# Altium integrated library BYTECH_HW_LIB_2019.IntLib: 907 symbols (part 3 of 6)
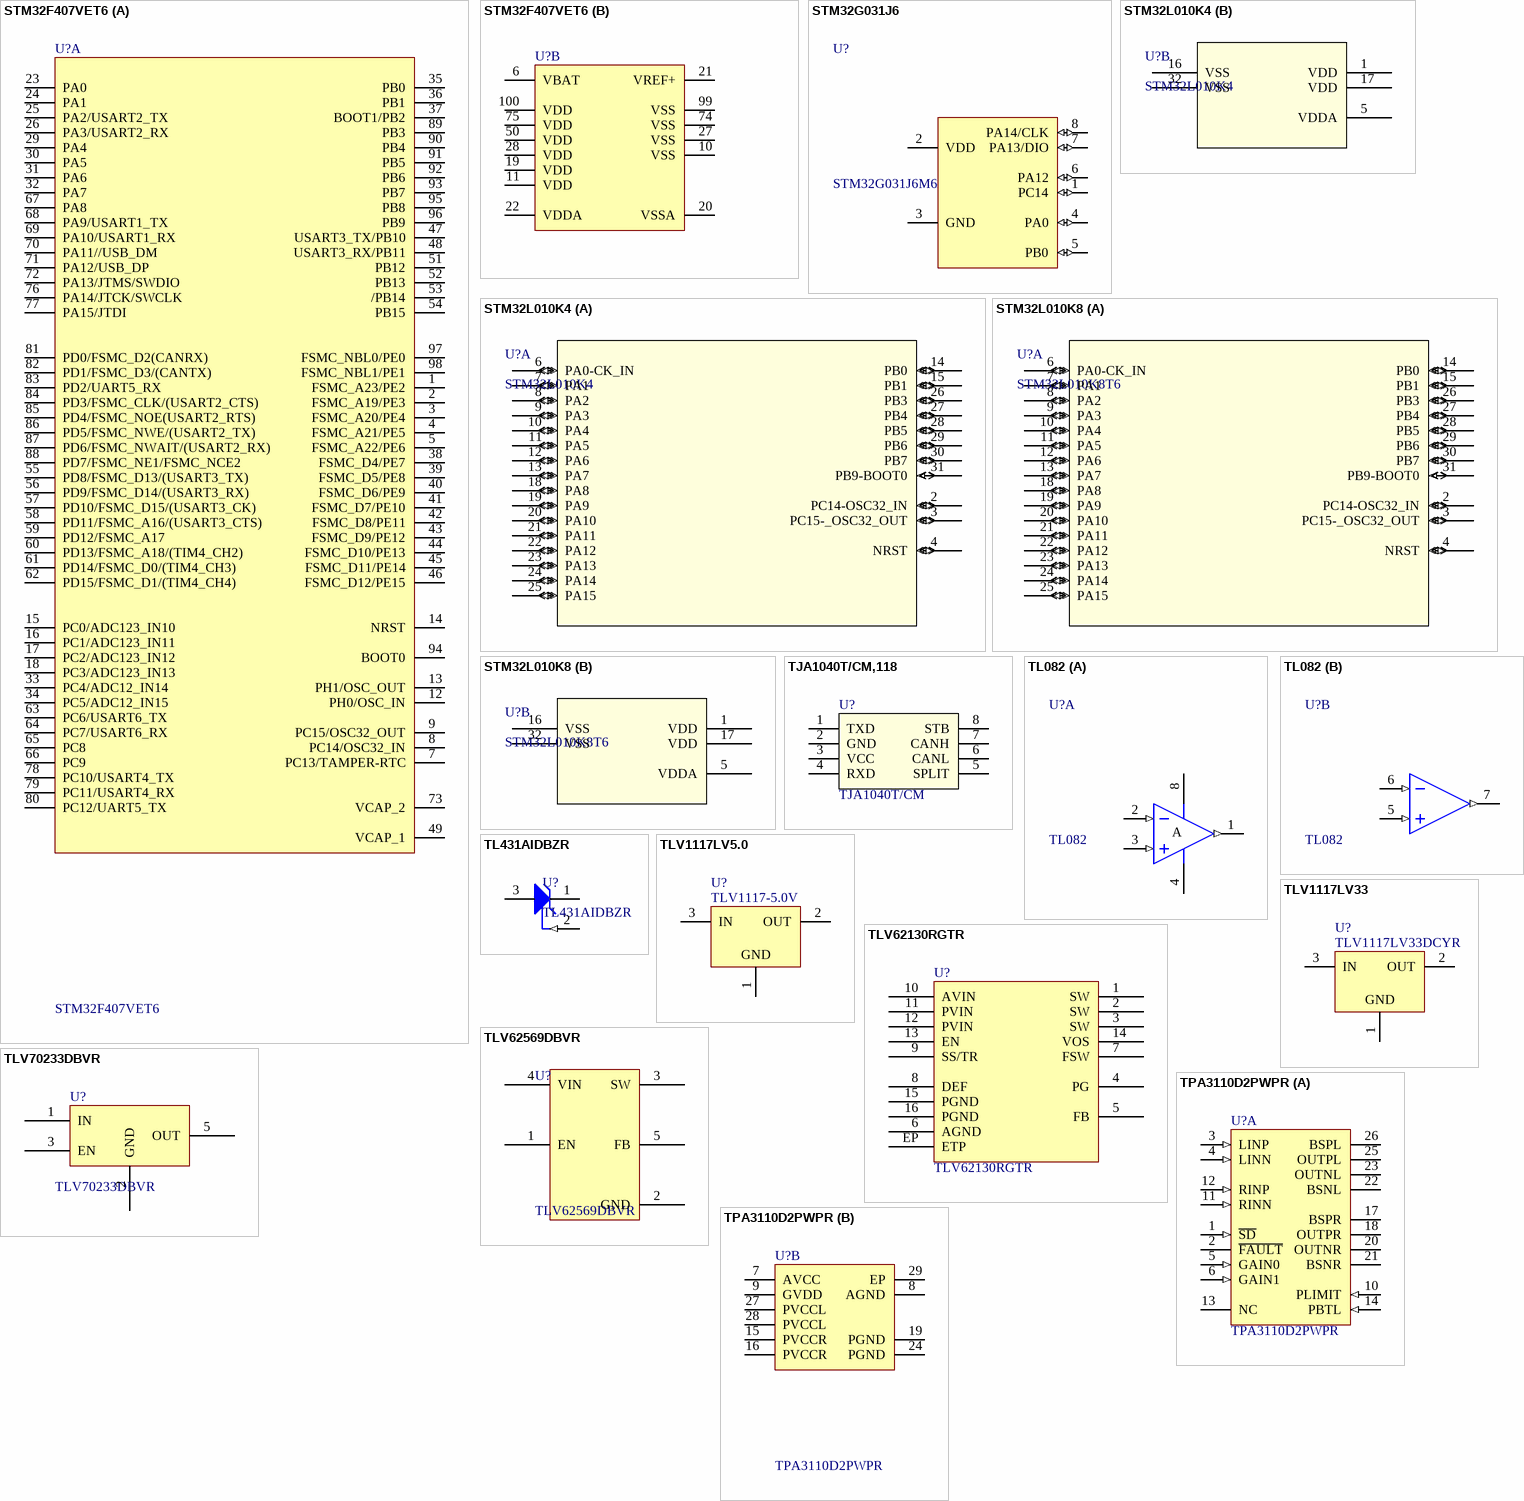
[diagram p41: symbols STM32F407VET6 to TPA3110D2PWPR]

## STM32F407VET6
designator U?
ARM Cortex-M4, 168 MHz, 192 kB RAM, 512 kB ROM; MFR: ST; MPN: STM32F407VET6
footprint LQFP-100 (Low Profile Quad Flat Pack (LQFP), 0.50 mm pitch; square, 25 pin X 25 pin, 14.00 mm L X 14.00 mm W X 1.60 mm H body)
part A pins: 1 FSMC_A23/PE2, 2 FSMC_A19/PE3, 3 FSMC_A20/PE4, 4 FSMC_A21/PE5, 5 FSMC_A22/PE6, 7 PC13/TAMPER-RTC, 8 PC14/OSC32_IN, 9 PC15/OSC32_OUT, 12 PH0/OSC_IN, 13 PH1/OSC_OUT, 14 NRST, 15 PC0/ADC123_IN10, 16 PC1/ADC123_IN11, 17 PC2/ADC123_IN12, 18 PC3/ADC123_IN13, 23 PA0, 24 PA1, 25 PA2/USART2_TX, 26 PA3/USART2_RX, 29 PA4, 30 PA5, 31 PA6, 32 PA7, 33 PC4/ADC12_IN14, 34 PC5/ADC12_IN15, 35 PB0, 36 PB1, 37 BOOT1/PB2, 38 FSMC_D4/PE7, 39 FSMC_D5/PE8, 40 FSMC_D6/PE9, 41 FSMC_D7/PE10, 42 FSMC_D8/PE11, 43 FSMC_D9/PE12, 44 FSMC_D10/PE13, 45 FSMC_D11/PE14, 46 FSMC_D12/PE15, 47 USART3_TX/PB10, 48 USART3_RX/PB11, 49 VCAP_1, 51 PB12, 52 PB13, 53 /PB14, 54 PB15, 55 PD8/FSMC_D13/(USART3_TX), 56 PD9/FSMC_D14/(USART3_RX), 57 PD10/FSMC_D15/(USART3_CK), 58 PD11/FSMC_A16/(USART3_CTS), 59 PD12/FSMC_A17, 60 PD13/FSMC_A18/(TIM4_CH2), 61 PD14/FSMC_D0/(TIM4_CH3), 62 PD15/FSMC_D1/(TIM4_CH4), 63 PC6/USART6_TX, 64 PC7/USART6_RX, 65 PC8, 66 PC9, 67 PA8, 68 PA9/USART1_TX, 69 PA10/USART1_RX, 70 PA11//USB_DM, 71 PA12/USB_DP, 72 PA13/JTMS/SWDIO, 73 VCAP_2, 76 PA14/JTCK/SWCLK, 77 PA15/JTDI, 78 PC10/USART4_TX, 79 PC11/USART4_RX, 80 PC12/UART5_TX, 81 PD0/FSMC_D2(CANRX), 82 PD1/FSMC_D3/(CANTX), 83 PD2/UART5_RX, 84 PD3/FSMC_CLK/(USART2_CTS), 85 PD4/FSMC_NOE(USART2_RTS), 86 PD5/FSMC_NWE/(USART2_TX), 87 PD6/FSMC_NWAIT/(USART2_RX), 88 PD7/FSMC_NE1/FSMC_NCE2, 89 PB3, 90 PB4, 91 PB5, 92 PB6, 93 PB7, 94 BOOT0, 95 PB8, 96 PB9, 97 FSMC_NBL0/PE0, 98 FSMC_NBL1/PE1
part B pins: 6 VBAT, 10 VSS, 11 VDD, 19 VDD, 20 VSSA, 21 VREF+, 22 VDDA, 27 VSS, 28 VDD, 50 VDD, 74 VSS, 75 VDD, 99 VSS, 100 VDD

## STM32G031J6
designator U?, comment STM32G031J6M6
MAINSTREAM ARM CORTEX-M0+ MCU WI; MFR: STM; Solder: SMT; MPN: STM32G031J6M6; Value: STM32G031J6M6; Category: IC; PinCount: 8
footprint SOIC-8
pins: 1 PC14 (io), 2 VDD, 3 GND, 4 PA0 (io), 5 PB0 (io), 6 PA12 (io), 7 PA13/DIO (io), 8 PA14/CLK (io)

## STM32L010K4
designator U?
ARM® Cortex®-M0+ STM32L0 MCUIC 32-Bit 32MHz 16KB (16K x 8); MFR: STMicroelectronics; Solder: SMT; MPM: STM32L010K4; Category: IC; PinCount: 32; Value: STM32L010K4
footprint STM-LQFP32_M (QFP, 32-Leads, Body 7x7mm, Pitch 0.8mm, IPC Low Density)
part A pins: 2 PC14-OSC32_IN (io), 3 PC15-_OSC32_OUT (io), 4 NRST (io), 6 PA0-CK_IN (io), 7 PA1 (io), 8 PA2 (io), 9 PA3 (io), 10 PA4 (io), 11 PA5 (io), 12 PA6 (io), 13 PA7 (io), 14 PB0 (io), 15 PB1 (io), 18 PA8 (io), 19 PA9 (io), 20 PA10 (io), 21 PA11 (io), 22 PA12 (io), 23 PA13 (io), 24 PA14 (io), 25 PA15 (io), 26 PB3 (io), 27 PB4 (io), 28 PB5 (io), 29 PB6 (io), 30 PB7 (io), 31 PB9-BOOT0 (in)
part B pins: 1 VDD (power), 5 VDDA (power), 16 VSS (power), 17 VDD (power), 32 VSS (power)

## STM32L010K8
designator U?, comment STM32L010K8T6
ARM® Cortex®-M0+ STM32L0 MCUIC 32-Bit 32MHz 16KB (16K x 8); MFR: STMicroelectronics; Solder: SMT; MPM: STM32L010K8T6; Category: IC; PinCount: 32; Value: STM32L010K8T6
footprint STM-LQFP32_M (QFP, 32-Leads, Body 7x7mm, Pitch 0.8mm, IPC Low Density)
part A pins: 2 PC14-OSC32_IN (io), 3 PC15-_OSC32_OUT (io), 4 NRST (io), 6 PA0-CK_IN (io), 7 PA1 (io), 8 PA2 (io), 9 PA3 (io), 10 PA4 (io), 11 PA5 (io), 12 PA6 (io), 13 PA7 (io), 14 PB0 (io), 15 PB1 (io), 18 PA8 (io), 19 PA9 (io), 20 PA10 (io), 21 PA11 (io), 22 PA12 (io), 23 PA13 (io), 24 PA14 (io), 25 PA15 (io), 26 PB3 (io), 27 PB4 (io), 28 PB5 (io), 29 PB6 (io), 30 PB7 (io), 31 PB9-BOOT0 (in)
part B pins: 1 VDD (power), 5 VDDA (power), 16 VSS (power), 17 VDD (power), 32 VSS (power)

## TJA1040T/CM,118
designator U?, comment TJA1040T/CM
IC TRANSCEIVER CAN 8SOIC; MPN: TJA1040T/CM,118; Solder: SMT; Value: TJA1040T/CM; Category: IC
footprint SOIC-8
pins: 1 TXD, 2 GND, 3 VCC, 4 RXD, 5 SPLIT, 6 CANL, 7 CANH, 8 STB

## TL082
designator U?
IC OPAMP JFET 2 CIRCUIT 8SO; MPN: TL082CDT; MFR: STM; Solder: SMT; Value: TL082; Category: IC; PinCount: 8
footprint SOIC-8
part A pins: 1 OUT (out), 2 IN- (in), 3 IN+ (in), 4 V- (power), 8 V+ (power)
part B pins: 5 IN+ (in), 6 IN- (in), 7 OUT (out)
part A text: A

## TL431AIDBZR
designator U?
IC VREF SHUNT ADJ SOT23-3; Solder: SMT; MPN: TL431AIDBZR; Value: TL431AIDBZR; Category: IC
footprint SOT23_3 (SOT23, 3-Leads, Body 2,90x2,30mm, Pitch 0,95mm, IPC Medium Density)
pins: 1 CATHODE, 2 REF (in), 3 ANODE

## TLV1117LV5.0
designator U?, comment TLV1117-5.0V
IC REG LINEAR 5V 800MA SOT223-4; MFR: Texas Instruments; MPN: TLV1117-50CDCYR; Solder: SMT; Value: TLV1117-50; Category: IC
footprint SOT-223-4
pins: 1 GND (power) "Ground pin", 2 OUT (power) "Regulated output voltage pin.", 3 IN (power) "Input pin."

## TLV1117LV33
designator U?, comment TLV1117LV33DCYR
Single Output LDO, 1 A, Fixed 3.3 V Output, 2 to 5.5 V Input, 4-pin SOT-223 (DCY), -40 to 125 degC, Green (RoHS & no Sb/Br); MFR: Texas Instruments; Solder: SMT; MPN: TLV1117LV33DCYR; Value: TLV1117LV33; Category: IC
footprint SOT-223-4
pins: 1 GND (power) "Ground pin", 2 OUT (power) "Regulated output voltage pin.", 3 IN (power) "Input pin."

## TLV62130RGTR
designator U?
IC REG BUCK ADJ 3A SYNC 16QFN; Solder: SMT; MPN: TLV62130RGTR; Value: TLV62130RGTR; Category: IC
footprint QFN16 30X30 (QFN, 16-Leads, Body 3.00x3.00mm, Pitch 0.50mm, Thermal Pad 1.70x1.70mm, IPC Medium Density)
pins: 1 SW, 2 SW, 3 SW, 4 PG, 5 FB, 6 AGND, 7 FSW, 8 DEF, 9 SS/TR, 10 AVIN, 11 PVIN, 12 PVIN, 13 EN, 14 VOS, 15 PGND, 16 PGND, EP ETP

## TLV62569DBVR
designator U?
IC REG BUCK ADJ 2A SOT23-5; MFR: Texas Instruments; Solder: SMT; MPN: TLV62569DBVR; Value: TLV62569DBVR; Category: IC; PinCount: 5
footprint SOT23-5
pins: 1 EN, 2 GND, 3 SW, 4 VIN, 5 FB

## TLV70233DBVR
designator U?
IC REG LDO 3.3V 0.3A SOT23-5; Solder: SMT; MPN: TLV70233DBVR; Value: TLV70233DBVR; Category: IC
footprint SOT23-5
pins: 1 IN, 2 GND, 3 EN, 5 OUT

## TPA3110D2PWPR
designator U?
15 W Filter-Free Class D Stereo Amplifier with SpeakerGuard(TM), -40 to 85 degC, 28-pin SOP (PWP28), Green (RoHS & no Sb/Br); MFR: Texas Instruments; Solder: SMT; MPN: TPA3110D2PWPR; Value: TPA3110D2PWPR; CompanyID: *
footprint TI-PWP28-5720X1950TP_L (SOP, 28-Leads, Body 9.8x4.5mm, Pitch 0.65mm, Thermal Pad 6.17x2.4mm, IPC High Density)
part A pins: 1 ~{SD} (in) "Shutdown logic input for audio amp (LOW = outputs Hi-Z, HIGH = outputs enabled). TTL logic levels with compliance to AVCC.", 2 ~{FAULT} (oc) "Open drain output used to display short circuit or dc detect fault status. Voltage compliant to AVCC. Short circuit faults can be set to auto-recovery by connecting F\A\U\L\T\ pin to S\D\ pin. Otherwise, both short circuit (See Datasheet)", 3 LINP (in) "Positive audio input for left channel. Biased at 3V.", 4 LINN (in) "Negative audio input for left channel. Biased at 3V.", 5 GAIN0 (in) "Gain select least significant bit. TTL logic levels with compliance to AVCC.", 6 GAIN1 (in) "Gain select most significant bit. TTL logic levels with compliance to AVCC.", 10 PLIMIT (in) "Power limit level adjust. Connect a resistor divider from GVDD to GND to set power limit. Connect directly to GVDD for no power limit", 11 RINN (in) "Negative audio input for right channel. Biased at 3V.", 12 RINP (in) "Positive audio input for right channel. Biased at 3V.", 13 NC "Not connected", 14 PBTL (in) "Parallel BTL mode switch", 17 BSPR "Bootstrap I/O for right channel, positive high-side FET.", 18 OUTPR (hiz) "Class-D H-bridge positive output for right channel.", 20 OUTNR (hiz) "Class-D H-bridge negative output for right channel.", 21 BSNR "Bootstrap I/O for right channel, negative high-side FET.", 22 BSNL "Bootstrap I/O for left channel, negative high-side FET.", 23 OUTNL (hiz) "Class-D H-bridge negative output for left channel.", 25 OUTPL (hiz) "Class-D H-bridge positive output for left channel.", 26 BSPL "Bootstrap I/O for left channel, positive high-side FET."
part B pins: 7 AVCC (power) "Analog supply", 8 AGND (power) "Analog signal ground. Connect to the thermal pad.", 9 GVDD (power) "High-side FET gate drive supply. Nominal voltage is 7V. Also should be used as supply for PLIMIT function", 15 PVCCR (power) "Power supply for right channel H-bridge. Right channel and left channel power supply inputs are connect internally", 16 PVCCR (power) "Power supply for right channel H-bridge. Right channel and left channel power supply inputs are connect internally.", 19 PGND (power) "Power ground for the H-bridges.", 24 PGND (power) "Power ground for the H-bridges.", 27 PVCCL (power) "Power supply for left channel H-bridge. Right channel and left channel power supply inputs are connect internally", 28 PVCCL (power) "Power supply for left channel H-bridge. Right channel and left channel power supply inputs are connect internally", 29 EP (power)

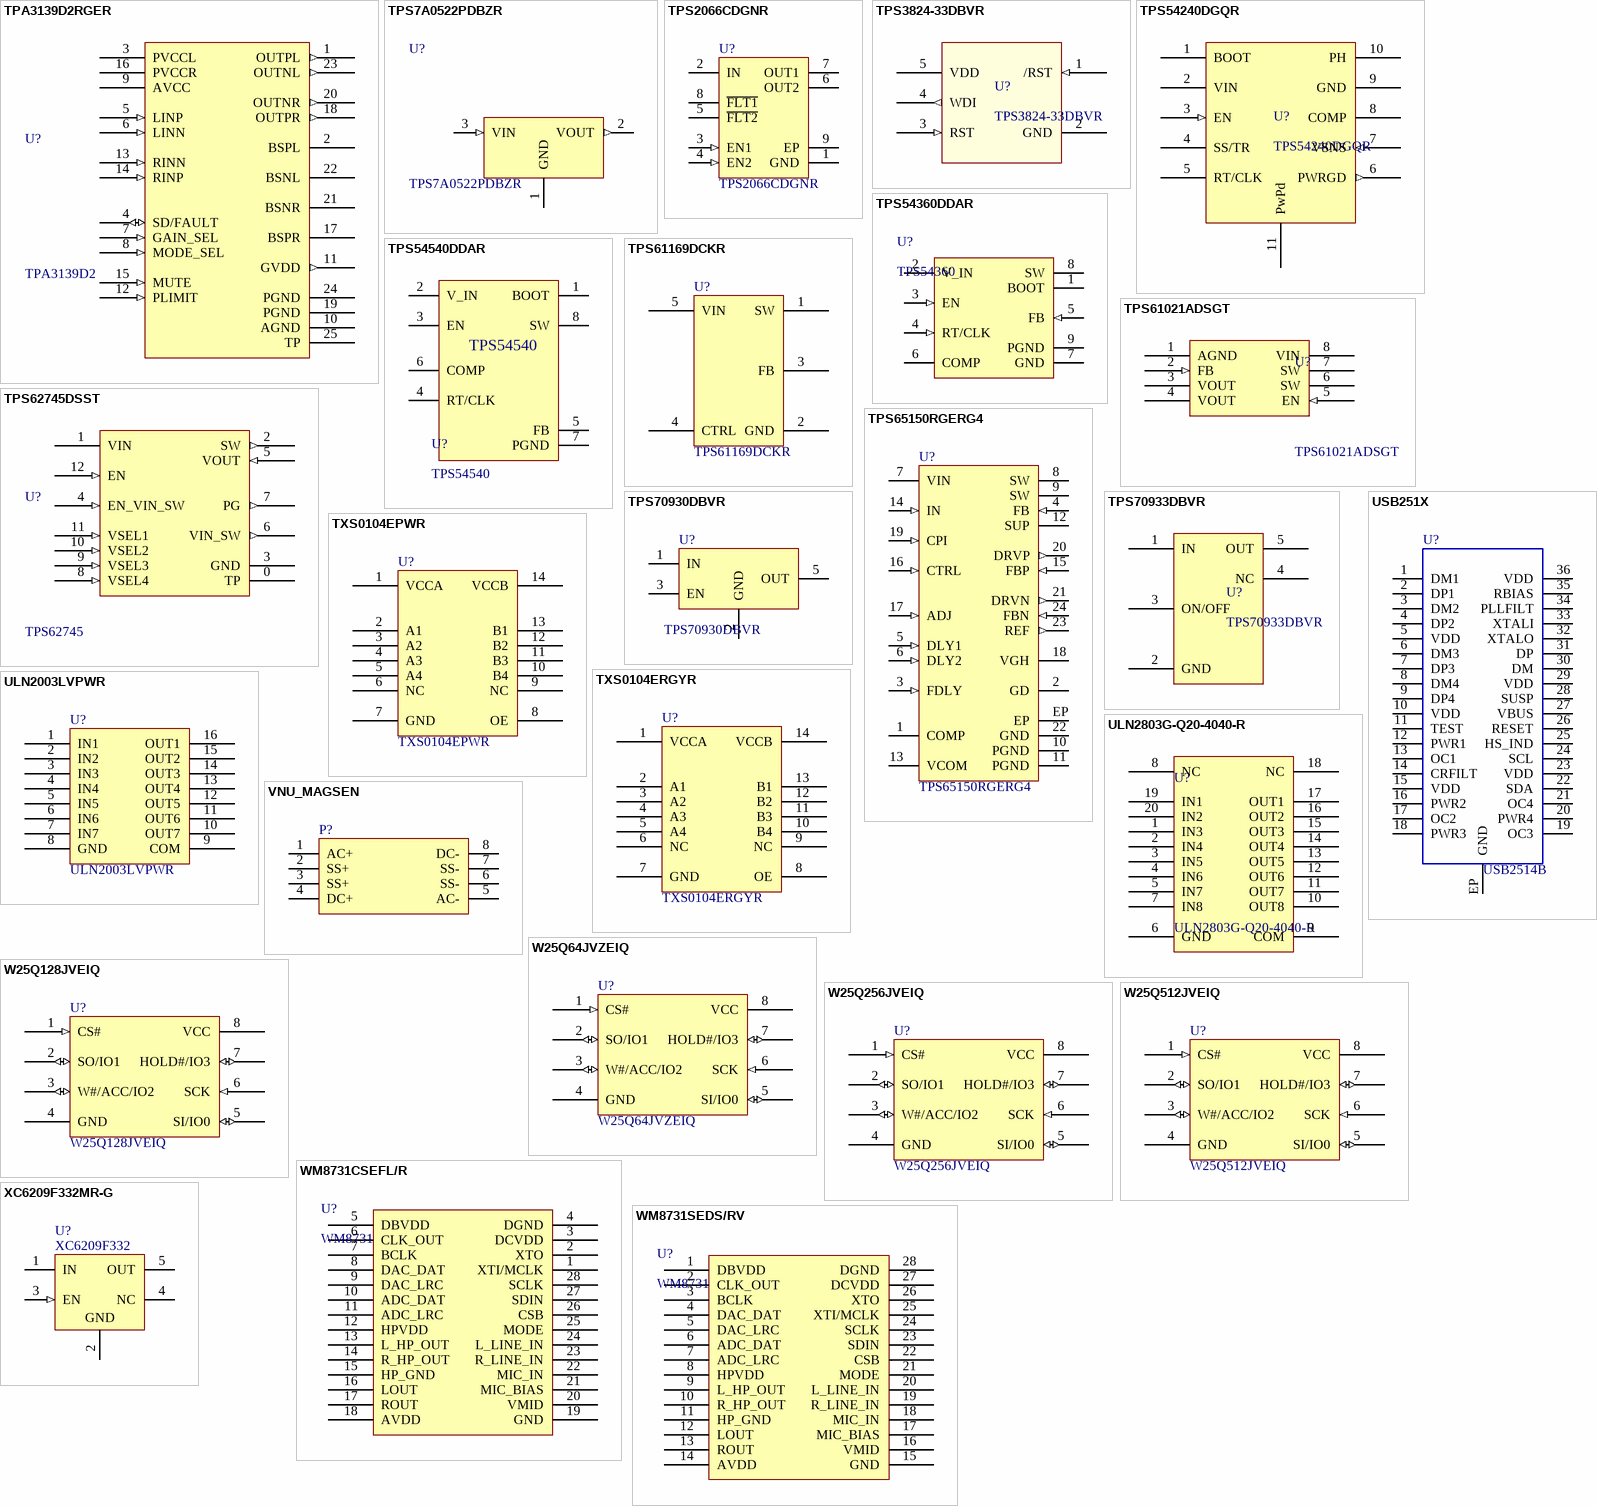
[diagram p15: symbols TPA3139D2RGER to XC6209F332MR-G]

## TPA3139D2RGER
designator U?, comment TPA3139D2
10W 3.5V–14.4V stereo QFN Class-D audio amplifier; MPN: TPA3139D2RGER; Solder: SMT; Value: TPA3139D2; Category: IC; PinCount: 24
footprint QFN50P400X400X100_HS-25N (Footprint not found)
pins: 1 OUTPL (out), 2 BSPL (power), 3 PVCCL (power), 4 SD/FAULT (io), 5 LINP (in), 6 LINN (in), 7 GAIN_SEL (in), 8 MODE_SEL (in), 9 AVCC (power), 10 AGND (power), 11 GVDD (out), 12 PLIMIT (in), 13 RINN (in), 14 RINP (in), 15 MUTE (in), 16 PVCCR (power), 17 BSPR (power), 18 OUTPR (out), 19 PGND (power), 20 OUTNR (out), 21 BSNR (power), 22 BSNL (power), 23 OUTNL (out), 24 PGND (power), 25 TP (power)

## TPS7A0522PDBZR
designator U?
IC POWER MANAGEMENT; MFR: TI; Solder: SMT; MPN: TPS7A0522PDBZR; Value: TPS7A0522PDBZR; Category: IC; PinCount: 3
footprint SOT23_3 (SOT23, 3-Leads, Body 2,90x2,30mm, Pitch 0,95mm, IPC Medium Density)
pins: 1 GND, 2 VOUT (out), 3 VIN (in)

## TPS2066CDGNR
designator U?
Dual-Channel, Current-Limited, Power-Distribution Switch, 1.11 to 1.85 A Current Limit, -40 to 85 degC, 8-pin MSOP-PowerPAD (DGN), Green (RoHS & no Sb/Br); Solder: SMT; MPN: TPS2066CDGNR; Value: TPS2066CDGNR; Category: IC
pins: 1 GND (power) "Ground connection", 2 IN (power) "Input voltage and power-switch drain; connect a 0.1 uF or greater ceramic capacitor from IN to GND close to the IC", 3 EN1 (in) "Enable input channel 1, logic high turns on power switch", 4 EN2 (in) "Enable input channel 2, logic high turns on power switch", 5 ~{FLT2} (hiz) "Active-low open-drain output, asserted during overcurrent, or overtemperature conditions on channel 2", 6 OUT2 (power) "Power-switch output channel 2, connected to load", 7 OUT1 (power) "Power-switch output channel 1, connected to load", 8 ~{FLT1} (hiz) "Active-low open-drain output, asserted during overcurrent, or overtemperature conditions on channel 1", 9 EP (power) "Internally connected to GND; used to heat-sink the part to the circuit board traces. Connect PAD to GND plane as a heatsink."

## TPS3824-33DBVR
designator U?
IC 2.93V SUPPLY MONITOR SOT-23-5; Solder: SMT; Value: TPS3824-33DBVR; MPN: TPS3824-33DBVR; Category: IC
footprint SOT23-5
pins: 1 /RST (in), 2 GND (power), 3 RST (in), 4 WDI (out), 5 VDD (power)

## TPS54240DGQR
designator U?
IC REG BCK SPLIT RAIL ADJ 10MSOP; Solder: SMT; MPN: TPS54240DGQR; Value: TPS54240DGQR; Category: IC
footprint HVSSOP-10
pins: 1 BOOT, 2 VIN (power), 3 EN (in), 4 SS/TR, 5 RT/CLK, 6 PWRGD (out), 7 VSNS (in), 8 COMP, 9 GND (power), 10 PH, 11 PwPd

## TPS54360DDAR
designator U?, comment TPS54360
Step Down DC-DC Converter; MPN: TPS54360DDAR; Solder: SMT; Value: TPS54360; Category: IC
footprint SOIC-8-TP (SOIC 8 pin with Thermal Pad)
pins: 1 BOOT, 2 V_IN, 3 EN (in), 4 RT/CLK (in), 5 FB (in), 6 COMP, 7 GND, 8 SW, 9 TP hidden to PGND, 9 PGND

## TPS54540DDAR
designator U?, comment TPS54540
4.5-V to 42-V Input, 5 A, Step Down DC-DC Converter  with Eco-mode™; MPN: TPS54540DDAR; Solder: SMT; Value: TPS54540; Category: IC
footprint SOIC8 - TP (SOIC 8 pin with Thermal Pad)
pins: 1 BOOT, 2 V_IN, 3 EN, 4 RT/CLK, 5 FB, 6 COMP, 7 PGND, 8 SW, 9 TP hidden to PGND

## TPS61021ADSGT
designator U?
IC REG BOOST ADJ 3A 8WSON; Solder: SMT; MPN: TPS61021ADSGT; Value: TPS61021ADSGT; Category: IC
footprint WFDFN-8 (SON, 8-Leads, Body 2.00x2.00mm, Pitch 0.50mm, Thermal Pad 1.60x0.64mm, IPC Medium Density)
pins: 1 AGND (power), 2 FB (in), 3 VOUT (power), 4 VOUT (power), 5 EN (in), 6 SW (power), 7 SW (power), 8 VIN (power)

## TPS61169DCKR
designator U?
IC LED DRVR RGLTR DIM 1.8A SC70; Solder: SMT; MPN: TPS61169DCKR; Value: TPS61169DCKR; Category: IC
pins: 1 SW, 2 GND, 3 FB, 4 CTRL, 5 VIN

## TPS62745DSST
designator U?, comment TPS62745
IC REG BUCK PROG 300MA 12WSON; MPN: TPS62745DSST; MFR: Texas Instruments; Solder: SMT; Value: TPS62745; Category: IC; PinCount: 11
footprint WSON12_3x2 (Footprint not found)
pins: 0 TP, 1 VIN (power), 2 SW (out), 3 GND (power), 4 EN_VIN_SW (in), 5 VOUT (in), 6 VIN_SW (out), 7 PG (out), 8 VSEL4 (in), 9 VSEL3 (in), 10 VSEL2 (in), 11 VSEL1 (in), 12 EN (in)

## TPS65150RGERG4
designator U?
3-Channel LCD Bias with GPM, VCOM Buffer & Gate Driver for Isolation Switch, 1.8 to 6 V, -40 to 85 degC, 24-pin QFN (RGE24), Green (RoHS & no Sb/Br); Solder: SMT; MPN: TPS65150RGERG4; Value: TPS65150; Category: IC
pins: 1 COMP "This is the compensation pin for the main boost converter. A small capacitor and if required a series resistor is connected to this pin.", 2 GD (hiz) "Active low open drain output. This output is latched low when the boost converter Vs is in regulation. This signal can be used to drive an external MOSFET to provide isolation for Vs.", 3 FDLY (in) "Fault delay. Connecting a capacitor from this pin to Vin allows to set the delay time from the point when one of the outputs (VS, VGH, VGL) drops below its power good threshold until the devices enters the shutdown latch. To (See Datasheet)", 4 FB (in) "Feedback of the main boost converter generating Vsource (Vs).", 5 DLY1 (in) "Power-on sequencing adjust. Connecting a capacitor from this pin to GND allows to set the delay time between the boost converter output Vs and the negative charge pump VGL during startup.", 6 DLY2 (in) "Power-on sequencing adjust. Connecting a capacitor from this pin to GND allows to set the delay time between the negative charge pump VGL and the positive charge pump during startup. Note that Q5 in the Gate Voltage Shaping (See Datasheet)", 7 VIN (power) "This is the input voltage pin of the device.", 8 SW (power) "Switch pin of the boost converter", 9 SW (power) "Switch pin of the boost converter", 10 PGND (power) "Power ground", 11 PGND (power) "Power ground", 12 SUP (power) "Supply pin of the positive, negative charge pump and Boost Converter Gate Drive Circuit. This pin needs to be connected to the output of the main boost converter and can’t be to any other voltage rail.", 13 VCOM (power) "VCOM buffer output. Typically a 1-uF output capacitor is required on this pin.", 14 IN (in) "Input of the Vcom buffer. If this pin is connected to GND, the Vcom buffer is disabled.", 15 FBP (in) "Feedback pin of the positive charge pump.", 16 CTRL (in) "Control signal for the gate voltage shaping signal. Apply the control signal for the gate voltage control. Usually the timing controller of the LCD panel generates this signal. If this function is not required, this pin (See Datasheet)", 17 ADJ (in) "Gate voltage shaping circuit. Connecting a capacitor to this pin sets the fall time of the positive gate voltage (VGH).", 18 VGH (hiz) "Positive output voltage to drive the TFT gates with an adjustable falltime. This pin is internally connected with a MOSFET switch to the positive charge pump input CPI.", 19 CPI (in) "Input of the VGH isolation switch and gate voltage shaping circuit.", 20 DRVP (out) "Charge pump driver to generate the positive output voltage VGH.", 21 DRVN (out) "Charge pump driver to generate the negative voltage VGL.", 22 GND (power) "Analog ground", 23 REF (out) "Internal reference output typically 1.213 V", 24 FBN (in) "Feedback pin of the negative charge pump VGL.", EP (power) "The PowerPADTM needs to be soldered to GND"

## TPS70930DBVR
designator U?
IC REG LINEAR 3V 150MA SOT23-5; MFR: TI; Solder: SMT; MPN: TPS70930DBVR; Value: TPS70930DBVR; Category: IC
footprint SOT23-5
pins: 1 IN, 2 GND, 3 EN, 5 OUT

## TPS70933DBVR
designator U?
IC REG LINEAR 3.3V 150MA SOT23-5; MFR: Texas Instruments; Solder: SMT; MPN: TPS70933DBVR; Value: TPS70933DBVR; Category: IC
footprint SOT23-5
pins: 1 IN, 2 GND, 3 ON/OFF, 4 NC, 5 OUT

## TXS0104EPWR
designator U?
IC 4BIT NON-INV TRANSLTR 14TSSOP; Solder: SMT; Value: TXS0104EPWR; MPN: TXS0104EPWR; Category: IC
footprint TSOP65P640X120-14N (TSOP, 14-Leads, Body 5.00x4.40mm, Pitch 0.65mm, IPC Medium Density)
pins: 1 VCCA, 2 A1, 3 A2, 4 A3, 5 A4, 6 NC, 7 GND, 8 OE, 9 NC, 10 B4, 11 B3, 12 B2, 13 B1, 14 VCCB

## TXS0104ERGYR
designator U?
IC TRNSLTR BIDIRECTIONAL 14VQFN; MFR: Texas Instruments; Solder: SMT; Value: TXS0104ERGYR; MPN: TXS0104ERGYR; Category: IC; PinCount: 14
footprint QFN50P400X400X80_HS-15N (QFN, 14-Leads, Body 4.00x4.00mm, Pitch 0.50mm, Thermal Pad 2.05x2.05mm, IPC Medium Density)
pins: 1 VCCA, 2 A1, 3 A2, 4 A3, 5 A4, 6 NC, 7 GND, 8 OE, 9 NC, 10 B4, 11 B3, 12 B2, 13 B1, 14 VCCB

## ULN2003LVPWR
designator U?
IC DARL ARRAY 7CH 16TSSOP; MFR: Texas Instruments; Solder: SMT; CompanyID: VT-0; MPN: ULN2003LVPWR; Category: Integrated Circuits (ICs); Value: ULN2003LVPWR
footprint TSOP65P640X120-16N (TSOP, 16-Leads, Body 5.00x4.40mm, Pitch 0.65mm, IPC Medium Density)
pins: 1 IN1, 2 IN2, 3 IN3, 4 IN4, 5 IN5, 6 IN6, 7 IN7, 8 GND, 9 COM, 10 OUT7, 11 OUT6, 12 OUT5, 13 OUT4, 14 OUT3, 15 OUT2, 16 OUT1

## ULN2803G-Q20-4040-R
designator U?
IC DARL ARRAY 7CH QFN-20; MFR: UNISONIC; Solder: SMT; MPN: ULN2803G-Q20-4040-R; Category: Integrated Circuits (ICs); Value: ULN2803G-Q20-4040-R; PinCount: 20
footprint QFN-20(4x4) (Footprint not found)
pins: 1 IN3, 2 IN4, 3 IN5, 4 IN6, 5 IN7, 6 GND, 7 IN8, 8 NC, 9 COM, 10 OUT8, 11 OUT7, 12 OUT6, 13 OUT5, 14 OUT4, 15 OUT3, 16 OUT2, 17 OUT1, 18 NC, 19 IN1, 20 IN2

## USB251X
designator U?, comment USB2514B
IC HUB CTLR 4PORT USB 2.0 HS 36S; MPN: USB2514B/M2; Solder: SMT; Value: USB2514B; Category: IC
footprint QFN36(USB251x)
pins: 1 DM1, 2 DP1, 3 DM2, 4 DP2, 5 VDD, 6 DM3, 7 DP3, 8 DM4, 9 DP4, 10 VDD, 11 TEST, 12 PWR1, 13 OC1, 14 CRFILT, 15 VDD, 16 PWR2, 17 OC2, 18 PWR3, 19 OC3, 20 PWR4, 21 OC4, 22 SDA, 23 VDD, 24 SCL, 25 HS_IND, 26 RESET, 27 VBUS, 28 SUSP, 29 VDD, 30 DM, 31 DP, 32 XTALO, 33 XTALI, 34 PLLFILT, 35 RBIAS, 36 VDD, EP GND

## VNU_MAGSEN
designator P?
VNU Magnetic Sensor 2020; Solder: WAVE
footprint VNU_MAG_SEN_V1.0_DIP
footprint VNU_MAG_SEN_V1.0_SMD
pins: 1 AC+, 2 SS+, 3 SS+, 4 DC+, 5 AC-, 6 SS-, 7 SS-, 8 DC-

## W25Q64JVZEIQ
designator U?
IC FLASH 64M SPI 133MHZ 8WSON; MFR: Winbond Electronics; Solder: SMT; MPN: W25Q64JVZEIQ; Value: W25Q64JVZEIQ; Category: IC; PinCount: 9
footprint WSON-8 (6x8mm)
pins: 1 CS# (in), 2 SO/IO1 (io), 3 W#/ACC/IO2 (io), 4 GND (power), 5 SI/IO0 (io), 6 SCK (in), 7 HOLD#/IO3 (io), 8 VCC (power)

## W25Q128JVEIQ
designator U?
IC FLASH 128M SPI 133MHZ 8WSON; MFR: Winbond Electronics; Solder: SMT; MPN: W25Q128JVEIQ; Value: W25Q128JVEIQ; Category: IC; PinCount: 9
footprint WSON-8 (6x8mm)
pins: 1 CS# (in), 2 SO/IO1 (io), 3 W#/ACC/IO2 (io), 4 GND (power), 5 SI/IO0 (io), 6 SCK (in), 7 HOLD#/IO3 (io), 8 VCC (power)

## W25Q256JVEIQ
designator U?
IC FLASH 256M SPI 133MHZ 8WSON; MFR: Winbond Electronics; Solder: SMT; MPN: W25Q256JVEIQ; Value: W25Q256JVEIQ; Category: IC; PinCount: 9
footprint WSON-8 (6x8mm)
pins: 1 CS# (in), 2 SO/IO1 (io), 3 W#/ACC/IO2 (io), 4 GND (power), 5 SI/IO0 (io), 6 SCK (in), 7 HOLD#/IO3 (io), 8 VCC (power)

## W25Q512JVEIQ
designator U?
IC FLASH 512M-BIT 4KB UNIFORM; MFR: Winbond Electronics; Solder: SMT; MPN: W25Q512JVEIQ; Value: W25Q512JVEIQ; Category: IC; PinCount: 9
footprint WSON-8 (6x8mm)
pins: 1 CS# (in), 2 SO/IO1 (io), 3 W#/ACC/IO2 (io), 4 GND (power), 5 SI/IO0 (io), 6 SCK (in), 7 HOLD#/IO3 (io), 8 VCC (power)

## WM8731CSEFL/R
designator U?, comment WM8731
IC CODEC PORT INTERNET 28QFN; MPN: WM8731CSEFL/R; Solder: SMT; Value: WM8731; Category: IC
footprint QFN50P500X500X85_HS-29N (QFN, 28-Leads, Body 5.00x5.00mm, Pitch 0.50mm, Thermal Pad 3.10x3.10mm, IPC Medium Density)
pins: 1 XTI/MCLK, 2 XTO, 3 DCVDD, 4 DGND, 5 DBVDD, 6 CLK_OUT, 7 BCLK, 8 DAC_DAT, 9 DAC_LRC, 10 ADC_DAT, 11 ADC_LRC, 12 HPVDD, 13 L_HP_OUT, 14 R_HP_OUT, 15 HP_GND, 16 LOUT, 17 ROUT, 18 AVDD, 19 GND, 20 VMID, 21 MIC_BIAS, 22 MIC_IN, 23 R_LINE_IN, 24 L_LINE_IN, 25 MODE, 26 CSB, 27 SDIN, 28 SCLK

## WM8731SEDS/RV
designator U?, comment WM8731
IC CODEC PORT INTERNET 28SSOP; MPN: WM8731SEDS/RV; Solder: SMT; Value: WM8731; Category: IC
footprint SSOP28 (Footprint not found)
pins: 1 DBVDD, 2 CLK_OUT, 3 BCLK, 4 DAC_DAT, 5 DAC_LRC, 6 ADC_DAT, 7 ADC_LRC, 8 HPVDD, 9 L_HP_OUT, 10 R_HP_OUT, 11 HP_GND, 12 LOUT, 13 ROUT, 14 AVDD, 15 GND, 16 VMID, 17 MIC_BIAS, 18 MIC_IN, 19 R_LINE_IN, 20 L_LINE_IN, 21 MODE, 22 CSB, 23 SDIN, 24 SCLK, 25 XTI/MCLK, 26 XTO, 27 DCVDD, 28 DGND

## XC6209F332MR-G
designator U?, comment XC6209F332
IC REG LINEAR 3.3V 300MA SOT25; MFR: Torex Semiconductor Ltd; MPN: XC6209F332MR-G; Solder: SMT; PinCount: 5; ComponentLink1Description: Manufacturer URL; ComponentLink2URL: http://www.ti.com/general/docs/lit/getliterature.tsp?genericPartNumber=TLV70233&fileType=pdf; ComponentLink3URL: http://www.ti.com/litv/pdf/mpds018i; ComponentLink2Description: Datasheet; Value: XC6209F332; ComponentLink1URL: http://www.ti.com/; ComponentLink3Description: Package Specification; Category: IC
footprint SOT23-5
pins: 1 IN (power) "Input supply voltage", 2 GND (power) "Ground", 3 EN (in) "Enable input", 4 NC "No connected", 5 OUT (power) "Regulated output voltage"

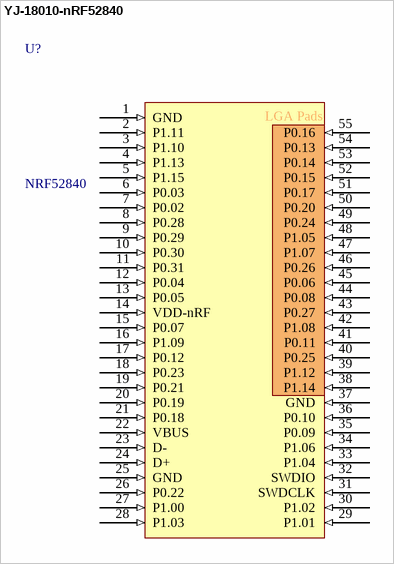
[diagram p16: symbol YJ-18010-nRF52840]

## YJ-18010-nRF52840
designator U?, comment NRF52840
MPN: YJ-18010-nRF52840; MFR: HOLYIOT; Solder: SMT; Value: NRF52840; Category: IC; PinCount: 55
footprint YJ-18010-nRF52840 (Footprint not found)
pins: 1 GND (in) "Ground", 2 P1.11 (in) "Digital I/O Trace data", 3 P1.10 (in) "Digital I/O", 4 P1.13 (in) "Digital I/O", 5 P1.15 (in) "Digital I/O", 6 P0.03 (in) "Digital I/O Analog input", 7 P0.02 (in) "Digital I/O Analog input", 8 P0.28 (in) "Digital I/O Analog input", 9 P0.29 (in) "Digital I/O Analog input", 10 P0.30 (in) "Digital I/O Analog input", 11 P0.31 (in) "Digital I/O Analog input", 12 P0.04 (in) "Digital I/O Analog input", 13 P0.05 (in) "Digital I/O Analog input", 14 VDD-nRF (in) "VDD (3.9v max)", 15 P0.07 (in) "Digital I/O Trace clock", 16 P1.09 (in) "Digital I/O Trace data", 17 P0.12 (in) "Digital I/O Trace data", 18 P0.23 (in) "Digital I/O", 19 P0.21 (in) "Digital I/O", 20 P0.19 (in) "Digital I/O", 21 P0.18 (in) "Digital I/O", 22 VBUS (in) "Power (5.8v max)", 23 D- (in) "Digital I/O", 24 D+ (in) "Digital I/O", 25 GND (in) "Ground", 26 P0.22 (in) "Digital I/O", 27 P1.00 (in) "Digital I/O", 28 P1.03 (in) "Digital I/O", 29 P1.01 (in) "Digital I/O", 30 P1.02 (in) "Digital I/O", 31 SWDCLK (in) "SWD for debug and programming", 32 SWDIO (in) "SWD for debug and programming", 33 P1.04 (in) "Digital I/O", 34 P1.06 (in) "Digital I/O", 35 P0.09 (in) "Digital I/O NFC input", 36 P0.10 (in) "Digital I/O NFC input", 37 GND (in) "Ground", 38 P1.14 (in) "Digital I/O", 39 P1.12 (in) "Digital I/O", 40 P0.25 (in) "Digital I/O", 41 P0.11 (in) "Digital I/O", 42 P1.08 (in) "Digital I/O", 43 P0.27 (in) "Digital I/O", 44 P0.08 (in) "Digital I/O", 45 P0.06 (in) "Digital I/O", 46 P0.26 (in) "Digital I/O", 47 P1.07 (in) "Digital I/O", 48 P1.05 (in) "Digital I/O", 49 P0.24 (in) "Digital I/O", 50 P0.20 (in) "Digital I/O", 51 P0.17 (in) "Digital I/O", 52 P0.15 (in) "Digital I/O", 53 P0.14 (in) "Digital I/O", 54 P0.13 (in) "Digital I/O", 55 P0.16 (in) "Digital I/O"


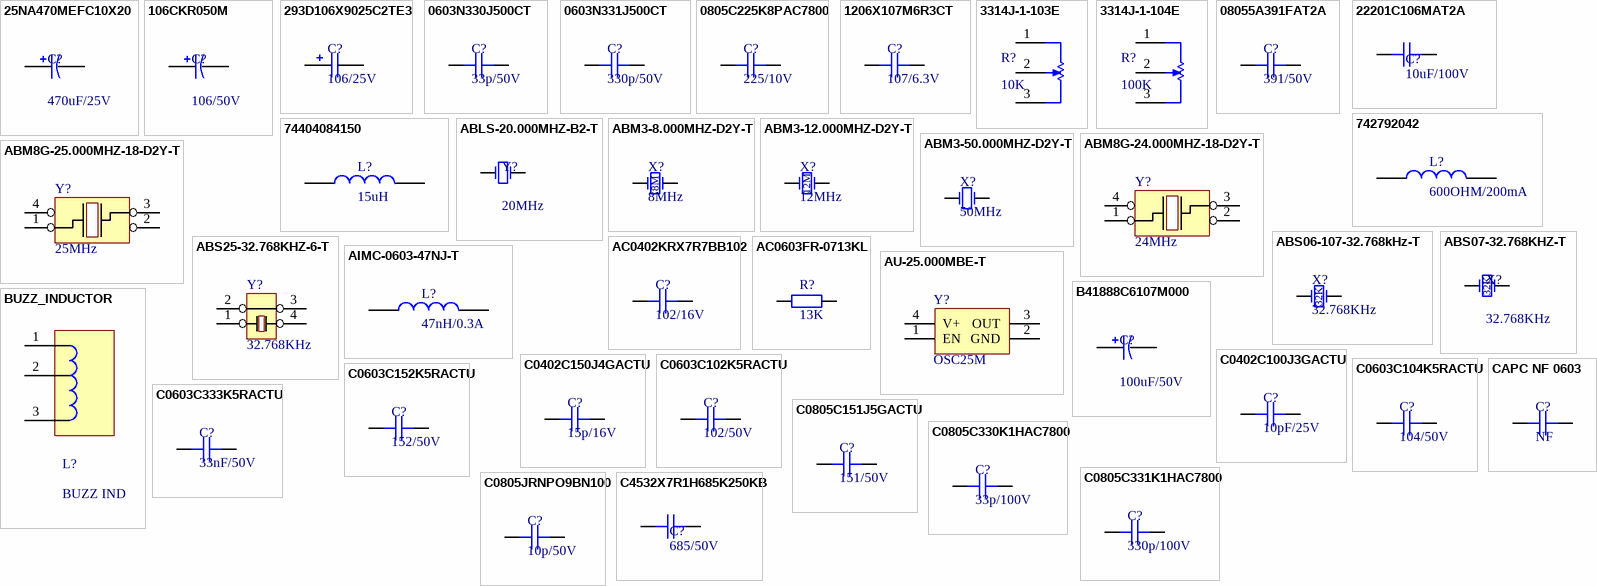
[diagram p17: symbols 25NA470MEFC10X20 to CAPC NF 0603]